# Altium footprint library Lib_001.PcbLib: 429 footprints (part 27 of 28)
Each footprint in its own frame and in the unit in brackets; x right, y up, seen from the top. Pads: shape width x height; smd on the part's side, far side on the other; paste and mask are expansions set on the pad; w line width, h text height; cw(c..) or ccw(c..) is an arc to the next point about the centre after c.
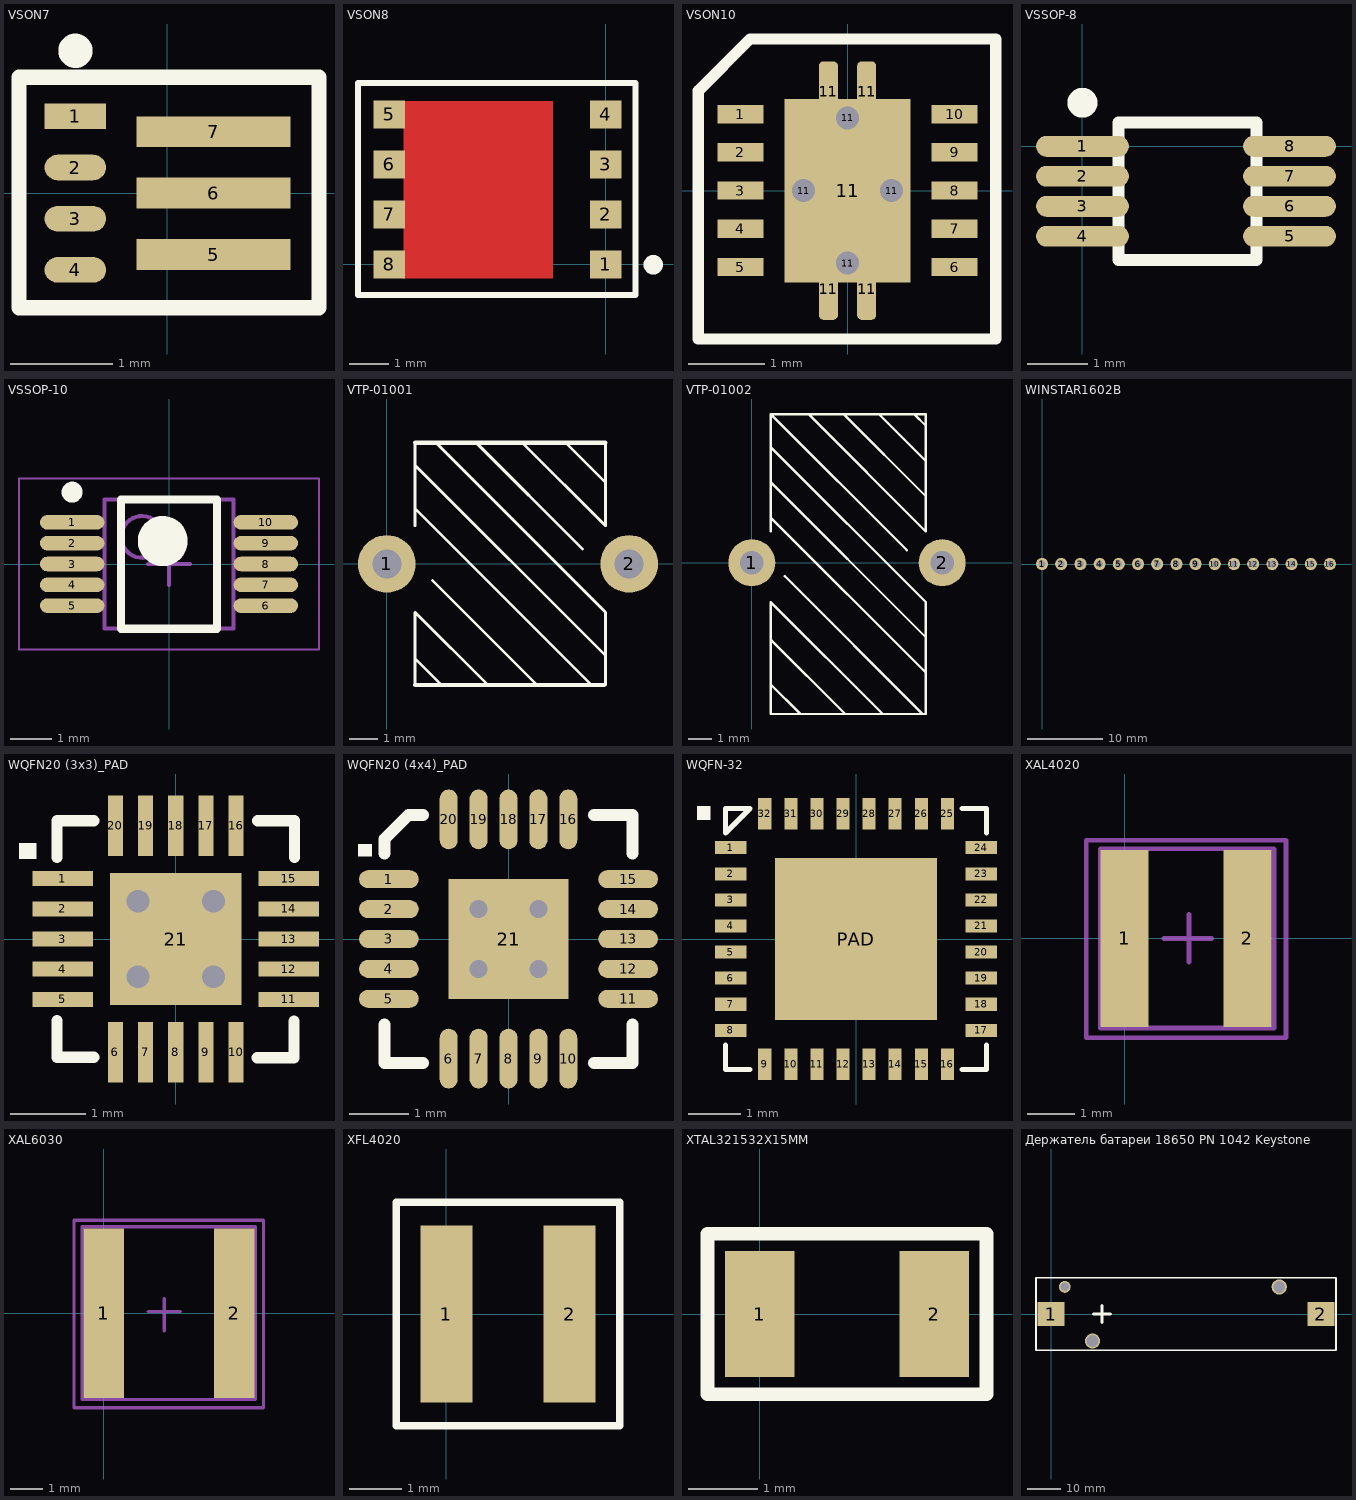
[diagram p26: the footprints below, top view; thin cyan lines are the x and y axes]

## VSON7 [mm]
pads (7):
  rect 0.6x0.25 smd mask+0.07: 1(-0.9,0.75)
  oval 0.6x0.25 smd mask+0.07: 2(-0.9,0.25) 3(-0.9,-0.25) 4(-0.9,-0.75)
  rect 1.5x0.3 smd mask+0.07: 5(0.45,-0.6) 6(0.45,0) 7(0.45,0.6)
Top Overlay:
  circle w0.254: c-0.899,1.39 r0.04
  lines w0.15: -1.45,-1.121 -1.45,1.132 1.48,1.132 1.48,-1.121 -1.45,-1.121
3D body "RLT0007A.stp": height 1, standoff 0, extent -1,-1 1,1

## VSON8 [mm]
pads (8):
  rect 0.8x0.7 smd: 1(0,0) 2(0,1.27) 3(0,2.54) 4(0,3.81) 5(-5.505,3.81) 6(-5.505,2.54) 7(-5.505,1.27) 8(-5.505,0)
Top Layer:
  rectangle: -5.142,-0.35 -1.343,4.156
Top Overlay:
  circle w0.254: c1.202,-0.007 r0.121
  lines w0.15: -6.298,-0.78 0.751,-0.78 0.751,4.615 -6.298,4.615 -6.298,-0.78
3D body "User Library-VSON-8.step": height 1, standoff 0, extent -5.777,-0.585 0.225,4.415

## VSON10 [mm]
pads (19):
  rect 0.6x0.24 smd: 1(-1.4,1) 2(-1.4,0.5) 3(-1.4,0) 4(-1.4,-0.5) 5(-1.4,-1) 6(1.4,-1) 7(1.4,-0.5) 8(1.4,0) 9(1.4,0.5) 10(1.4,1)
  round 0.2 hole 0.3 unplated: 11(-0.575,0) 11(0,-0.95) 11(0,0.95) 11(0.575,0)
  rrect50% 0.25x0.8 smd: 11(-0.25,-1.29) 11(-0.25,1.29) 11(0.25,-1.29) 11(0.25,1.29)
  rect 1.65x2.4 smd: 11(0,0)
Top Overlay:
  lines w0.15: -1.954,-1.941 -1.954,1.302 -1.274,1.982 1.94,1.982 1.94,-1.941 -1.954,-1.941
3D body "User Library-PVSON-10-1.step": height 0.9, standoff 0, extent -1.501,-1.501 1.501,1.501

## VSSOP-8 [mm]
pads (8):
  oval 1.55x0.35 smd: 1(0,0) 2(0,-0.5) 3(0,-1) 4(0,-1.5) 5(3.45,-1.5) 6(3.45,-1) 7(3.45,-0.5) 8(3.45,0)
Top Overlay:
  circle w0.25: c0,0.725 r0.125
  lines w0.2: 0.6,-1.9 2.9,-1.9 2.9,0.4 0.6,0.4 0.6,-1.9
3D body "User Library-VSSOP8-2.STEP": height 0.9, standoff 0, extent 0.125,-1.8 3.325,0.3

## VSSOP-10 [mm] "TSSOP, 10-Leads, Body 3,00x3,00mm, Pitch 0,50mm, IPC Low Density"
height 1.1
pads (10):
  oval 1.55x0.35 smd: 1(-2.325,1) 2(-2.325,0.5) 3(-2.325,0) 4(-2.325,-0.5) 5(-2.325,-1) 6(2.325,-1) 7(2.325,-0.5) 8(2.325,0) 9(2.325,0.5) 10(2.325,1)
Top Overlay:
  circle w0.6: c-0.15,0.55 r0.3
  circle w0.25: c-2.325,1.725 r0.125
  lines w0.2: -1.15,-1.55 1.15,-1.55 1.15,1.55 -1.15,1.55 -1.15,-1.55
Mechanical 13:
  circle w0.1: c-0.65,0.65 r0.5
  lines w0.1: -1.55,-1.55 1.55,-1.55 1.55,1.55 -1.55,1.55 -1.55,-1.55
Mechanical 15:
  lines w0.05: -3.6,-2.05 3.6,-2.05 3.6,2.05 -3.6,2.05 -3.6,-2.05
  lines w0.1: -0.5,0 0.5,0 ; 0,-0.5 0,0.5
3D body: height 1.1, standoff 0.15, extent -1.55,-1.55 1.55,1.55

## VTP-01001 [mm] "LOW COST  TOROIDAL  POWER INDUCTORS"
pads (2):
  round 2 hole 1: 1(0,0) 2(8.4,0)
Top Overlay:
  lines w0.1: 0.98,-4.2 0.98,-1.68 ; 0.98,-3.18 0.98,-3.28 1.915,-4.215 ; 0.98,1.32 0.98,4.2 3.1,4.2 6.78,0.52 ; 0.98,1.92 7.1,-4.2 ; 0.98,3.42 7.58,-3.18 ; 1.58,-0.58 5.22,-4.22 ; 1.695,4.205 7.58,-1.68 ; 3.505,-4.205 0.98,-1.68 ; 4.705,4.195 7.58,1.32 7.58,4.2 ; 6.19,4.21 7.58,2.82 ; 7.58,-4.2 7.58,-1.68 ; 0.98,-1.68 0.98,-1.68 ; 7.58,-3.18 7.58,-3.18 ; 7.58,-1.68 7.58,-1.68
  lines w0.15: 0.57,0 0.6,0 ; 0.99,-4.2 7.54,-4.2 ; 0.99,4.2 7.57,4.2
3D body "User Library-VTP-XXXXX (Premier Magnetics)(1).step": height 11.86, standoff -2.39, extent 1.06,-6.16 7.38,6.508

## VTP-01002 [mm] "LOW COST  TOROIDAL  POWER INDUCTORS"
pads (2):
  round 2 hole 1: 1(0,0) 2(8.1,0)
Top Overlay:
  lines w0.1: 0.8,-3.17 0.8,-3.27 3.94,-6.41 ; 0.8,1.33 0.8,6.32 ; 0.8,1.93 7.4,-4.67 ; 0.8,3.43 7.4,-3.17 ; 0.8,4.93 7.4,-1.67 ; 0.9,6.32 0.8,6.32 ; 1.4,-0.57 7.265,-6.435 ; 2.055,-6.425 0.8,-5.17 ; 2.405,6.325 7.4,1.33 7.4,6.32 0.8,6.32 ; 3.92,6.31 7.4,2.83 ; 5.4,6.33 7.4,4.33 ; 5.57,-6.44 0.8,-1.67 ; 6.6,0.53 0.8,6.33 ; 6.925,6.305 7.4,5.83 ; 0.8,-5.17 0.8,-5.17 ; 0.8,-1.67 0.8,-6.44 7.4,-6.44 7.4,-1.67 ; 0.8,-1.67 0.8,-1.67 ; 0.8,6.33 0.8,6.33 ; 7.4,-3.17 7.4,-3.17 ; 7.4,-1.67 7.4,-1.67 ; 7.4,4.33 7.4,4.33 ; 7.4,5.83 7.4,5.83
3D body "User Library-VTP-XXXXX (Premier Magnetics).step": height 14.54, standoff -3.92, extent 0.72,-8.81 7.43,8.03

## WINSTAR1602B [mm]
height 6
pads (16):
  round 1.6 hole 0.9: 1(0,0) 2(2.54,0) 3(5.08,0) 4(7.62,0) 5(10.16,0) 6(12.7,0) 7(15.24,0) 8(17.78,0) 9(20.32,0) 10(22.86,0) 11(25.4,0) 12(27.94,0) 13(30.48,0) 14(33.02,0) 15(35.56,0) 16(38.1,0)
3D body "User Library-Winstar WH1602B-1.STEP": height 17.7, standoff 4.7, extent -7.996,-34 72.004,2
3D body "User Library-PLS-1.STEP": height 9.44, standoff -2, extent 1.27,-1.27 3.81,1.27
3D body "User Library-PLS-1.STEP": height 9.44, standoff -2, extent 3.81,-1.27 6.35,1.27
3D body "User Library-PLS-1.STEP": height 9.44, standoff -2, extent -1.27,-1.27 1.27,1.27
3D body "User Library-PLS-1.STEP": height 9.44, standoff -2, extent 6.35,-1.27 8.89,1.27
3D body "User Library-PLS-1.STEP": height 9.44, standoff -2, extent 8.89,-1.27 11.43,1.27
3D body "User Library-PLS-1.STEP": height 9.44, standoff -2, extent 11.43,-1.27 13.97,1.27
3D body "User Library-PLS-1.STEP": height 9.44, standoff -2, extent 13.97,-1.27 16.51,1.27
3D body "User Library-PLS-1.STEP": height 9.44, standoff -2, extent 16.51,-1.27 19.05,1.27
3D body "User Library-PLS-1.STEP": height 9.44, standoff -2, extent 19.05,-1.27 21.59,1.27
3D body "User Library-PLS-1.STEP": height 9.44, standoff -2, extent 21.59,-1.27 24.13,1.27
3D body "User Library-PLS-1.STEP": height 9.44, standoff -2, extent 24.13,-1.27 26.67,1.27
3D body "User Library-PLS-1.STEP": height 9.44, standoff -2, extent 26.67,-1.27 29.21,1.27
3D body "User Library-PLS-1.STEP": height 9.44, standoff -2, extent 29.21,-1.27 31.75,1.27
3D body "User Library-PLS-1.STEP": height 9.44, standoff -2, extent 31.75,-1.27 34.29,1.27
3D body "User Library-PLS-1.STEP": height 9.44, standoff -2, extent 34.29,-1.27 36.83,1.27
3D body "User Library-PLS-1.STEP": height 9.44, standoff -2, extent 36.83,-1.27 39.37,1.27

## WQFN20 (3x3)_PAD [mm]
height 0.8
pads (21):
  rect 0.8x0.2 smd mask+0.05: 1(-1.5,0.8) 2(-1.5,0.4) 3(-1.5,0) 4(-1.5,-0.4) 5(-1.5,-0.8) 11(1.5,-0.8) 12(1.5,-0.4) 13(1.5,0) 14(1.5,0.4) 15(1.5,0.8)
  rect 0.2x0.8 smd mask+0.05: 6(-0.8,-1.5) 7(-0.4,-1.5) 8(0,-1.5) 9(0.4,-1.5) 10(0.8,-1.5) 16(0.8,1.5) 17(0.4,1.5) 18(0,1.5) 19(-0.4,1.5) 20(-0.8,1.5)
  rect 1.75x1.75 smd: 21(0,0)
via -0.5,0.5 diameter 0.6 hole 0.3
via 0.5,-0.5 diameter 0.6 hole 0.3
via 0.5,0.5 diameter 0.6 hole 0.3
via -0.5,-0.5 diameter 0.6 hole 0.3
Top Overlay:
  rectangle: -2.079,1.064 -1.848,1.276
  lines w0.15: -1.575,-1.08 -1.575,-1.568 -1.087,-1.568 ; -1.575,1.08 -1.575,1.568 -1.087,1.568 ; 1.08,-1.575 1.568,-1.575 1.568,-1.087 ; 1.087,1.568 1.575,1.568 1.575,1.08
3D body "User Library-QFN40P300X300X60-20.step": height 0.6, standoff 0, extent -1.55,-1.55 1.55,1.55

## WQFN20 (4x4)_PAD [mm]
pads (21):
  oval 1x0.3 smd: 1(-2,1) 2(-2,0.5) 3(-2,0) 4(-2,-0.5) 5(-2,-1) 11(2,-1) 12(2,-0.5) 13(2,0) 14(2,0.5) 15(2,1)
  oval 0.3x1 smd: 6(-1,-2) 7(-0.5,-2) 8(0,-2) 9(0.5,-2) 10(1,-2) 16(1,2) 17(0.5,2) 18(0,2) 19(-0.5,2) 20(-1,2)
  rect 2x2 smd: 21(0,0)
via -0.5,-0.5 diameter 0.6 hole 0.3
via 0.5,0.5 diameter 0.6 hole 0.3
via 0.5,-0.5 diameter 0.6 hole 0.3
via -0.5,0.5 diameter 0.6 hole 0.3
Top Overlay:
  rectangle: -2.517,1.378 -2.286,1.59
  lines w0.2: -2.075,-1.43 -2.075,-2.075 -1.43,-2.075 ; -2.075,1.43 -2.075,1.67 -1.67,2.075 -1.43,2.075 ; 1.43,-2.075 2.075,-2.075 2.075,-1.43 ; 1.43,2.075 2.075,2.075 2.075,1.43
3D body "User Library-QFN20_4x4x0_8.step": height 0.78, standoff -0.02, extent -2.01,-2.01 2.01,2.01

## WQFN-32 [mm]
height 1
pads (33):
  rect 0.6x0.25 smd: 1(-2.4,1.75) 2(-2.4,1.25) 3(-2.4,0.75) 4(-2.4,0.25) 5(-2.4,-0.25) 6(-2.4,-0.75) 7(-2.4,-1.25) 8(-2.4,-1.75) 17(2.401,-1.75) 18(2.401,-1.25) 19(2.401,-0.75) 20(2.401,-0.25) 21(2.401,0.25) 22(2.401,0.75) 23(2.401,1.25) 24(2.401,1.75)
  rect 0.25x0.6 smd: 9(-1.75,-2.4) 10(-1.25,-2.4) 11(-0.75,-2.4) 12(-0.25,-2.4) 13(0.25,-2.4) 14(0.75,-2.4) 15(1.25,-2.4) 16(1.75,-2.4) 25(1.75,2.4) 26(1.25,2.4) 27(0.75,2.4) 28(0.25,2.4) 29(-0.25,2.4) 30(-0.75,2.4) 31(-1.25,2.4) 32(-1.75,2.4)
  rect 3.1x3.1 smd: PAD(0,0)
Top Overlay:
  region: -3.048,2.54 -2.794,2.54 -2.794,2.286 -3.048,2.286
  lines w0.1: -2.5,-2.032 -2.5,-2.5 -2.032,-2.5 ; 2.032,-2.5 2.5,-2.5 2.5,-2.032 ; 2.032,2.5 2.5,2.5 2.5,2.032 ; -2.5,2.032 -2.5,2.5 -2.032,2.5 -2.5,2.032
3D body "User Library-MAX9984.STEP": height 0.74, standoff -0.01, extent -2.5,-2.5 2.5,2.5

## XAL4020 [mm]
pads (2):
  rect 1x3.7 smd: 1(0,0) 2(2.57,0)
Top Overlay:
  circle w0.254: c-0.275,-1.5 r0.075
Mechanical 13:
  lines w0.1: -0.5,-1.875 3.125,-1.875 3.125,1.875 -0.5,1.875 -0.5,-1.875
Mechanical 15:
  lines w0.1: 0.825,0 1.825,0 ; 1.35,-0.5 1.35,0.5 ; -0.8,-2.075 3.375,-2.075 3.375,2.05 -0.8,2.05 -0.8,-2.075
3D body "Coilcraft-XAL4020.step": height 2, standoff -0.1, extent -0.851,-2.111 3.449,2.189

## XAL6030 [mm]
pads (2):
  rect 1.25x5.25 smd: 1(0,0) 2(4.04,0)
Top Overlay:
  circle w0.254: c-0.075,-2.125 r0.112
Mechanical 13:
  lines w0.1: -0.675,-2.675 4.7,-2.675 4.7,2.675 1.419,2.675 0.606,2.675 -0.675,2.675 -0.675,0.763 -0.675,-2.675
Mechanical 15:
  lines w0.1: 1.375,0.05 2.375,0.05 ; 1.875,-0.55 1.875,0.45 ; -0.925,-2.925 4.95,-2.925 4.95,2.875 -0.925,2.875 -0.925,2.05 -0.925,1.019 -0.925,-1.044 -0.925,-2.925
3D body "Coilcraft-XAL6030-122.step": height 2, standoff -0.1, extent -1.274,-3.344 5.286,3.416

## XFL4020 [mm]
pads (2):
  rect 1x3.4 smd: 1(0,0) 2(2.37,0)
Top Overlay:
  lines w0.15: -0.965,-2.15 3.335,-2.15 3.335,2.15 -0.965,2.15 -0.965,-2.15
3D body "Coilcraft-XFL4020.step": height 2, standoff -0.1, extent -0.996,-2.11 3.304,2.19

## XTAL321532X15MM [mm] "KX-327NHT"
pads (2):
  rect 1x1.8 smd: 1(0,0) 2(2.5,0)
Top Overlay:
  lines w0.2: -0.75,-1.15 -0.75,1.15 3.25,1.15 3.25,-1.15 -0.75,-1.15
3D body "KX-327NHT.step": height 0.71, standoff 0, extent -0.35,-0.75 2.85,0.75

## Держатель батареи 18650 PN 1042 Keystone [mm]
pads (5):
  rect 8x7 all layers, no hole: 1(0,0) 2(79.7,0)
  round 3.5 hole 2.5: ""(4,8)
  round 4.5 hole 3.45: ""(12.22,-8) ""(67.42,8)
Top Overlay:
  lines w0.5: -4.5,-10.75 -4.5,10.75 84.2,10.75 84.2,-10.75 -4.5,-10.75
  lines w1: 12.5,0 17.5,0 ; 15,-2.5 15,2.5
3D body "Держатель батареи 18650 PN 1042 Keystone.stp": height 18.19, standoff -3.43, extent -3.15,-10.3 82.854,10.35